# Altium footprint library self_pcblib v1.8.6.PcbLib: 164 footprints (part 6 of 11)
Each footprint in its own frame and in the unit in brackets; x right, y up, seen from the top. Pads: shape width x height; smd on the part's side, far side on the other; paste and mask are expansions set on the pad; w line width, h text height; cw(c..) or ccw(c..) is an arc to the next point about the centre after c.
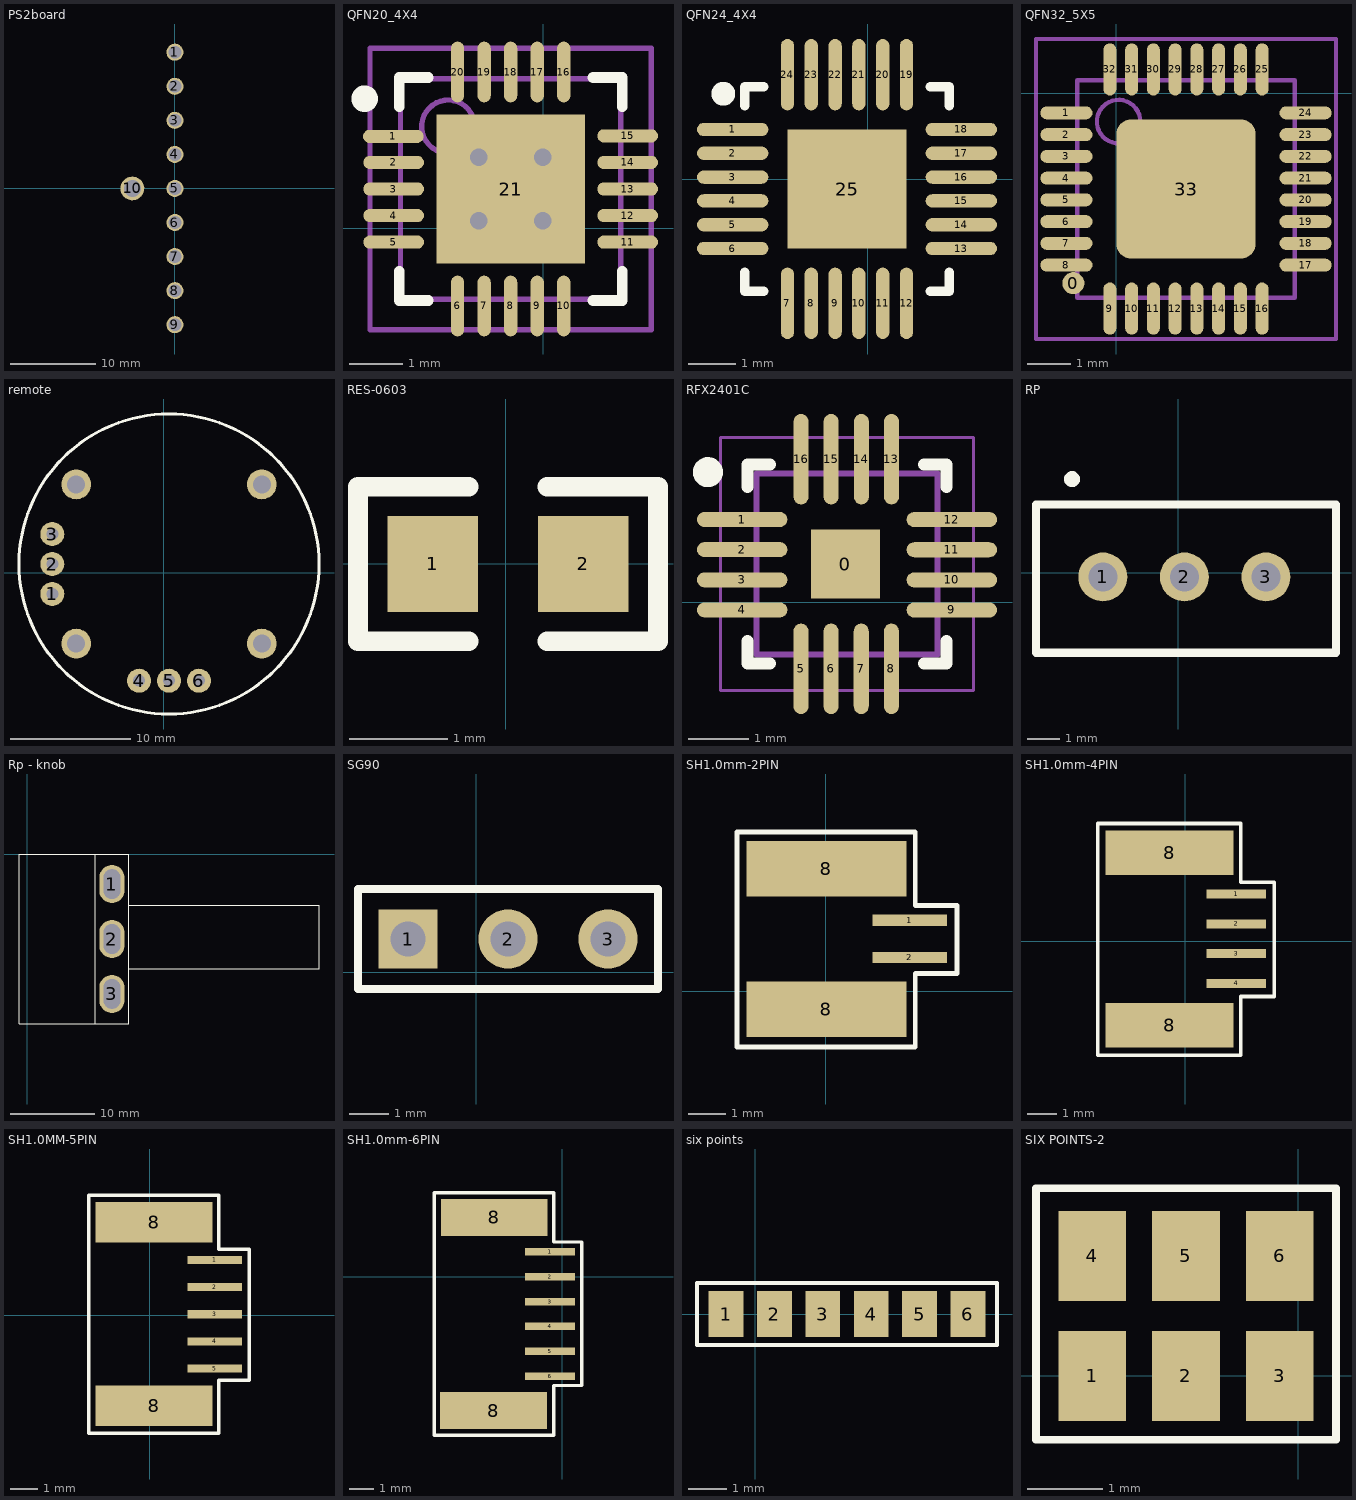
[diagram p5: the footprints below, top view; thin cyan lines are the x and y axes]

## PS2board [mm]
pads (10):
  round 2 hole 1.5: 1(0,16) 2(0,12) 3(0,8) 4(0,4) 5(0,0) 6(0,-4) 7(0,-8) 8(0,-12) 9(0,-16)
  round 2.8 hole 2: 10(-5,0)
Bottom Overlay:
  lines w0.203: 1.225,-17.673 -6,-17.673 -6,-12 -6,12 -6,17.546 1.987,17.546 ; 5,-13.665 5,14.072
  lines w0.254: 1.225,-17.673 ccw(c1.098,-13.792) 4.978,-13.665 ; 1.987,17.546 cw(c1.756,14.302) 5,14.072

## QFN20_4X4 [mil]
pads (21):
  oval 45x9.84 smd: 1(-111,68) 2(-110.74,48.69) 3(-110.74,29) 4(-110.74,9.31) 5(-110.74,-10.37) 11(62.74,-10.37) 12(62.74,9.31) 13(62.74,29) 14(62.74,48.69) 15(62.74,68.37)
  oval 9.84x45 smd: 6(-63.37,-57.74) 7(-43.69,-57.74) 8(-24,-57.74) 9(-4.32,-57.74) 10(15.37,-57.74) 16(15.37,115.74) 17(-4.32,115.74) 18(-24,115.74) 19(-43.69,115.74) 20(-63.37,115.74)
  rect 110.24x110.24 smd: 21(-24,29)
via -47.62,52.62 diameter 25.98 hole 12.99
via -0.38,52.62 diameter 25.98 hole 12.99
via -47.62,5.38 diameter 25.98 hole 12.99
via -0.38,5.38 diameter 25.98 hole 12.99
Top Overlay:
  circle w9.84: c-132.27,95.93 r4.92
  lines w7.87: -106.68,-32.02 -106.68,-53.68 -85.02,-53.68 ; -106.68,90.02 -106.68,111.68 -85.02,111.68 ; 37.02,-53.68 58.68,-53.68 58.68,-32.02 ; 37.02,111.68 58.68,111.68 58.68,90.02
Mechanical 13:
  circle w3.94: c-70.26,75.26 r19.68
  lines w3.94: -105.69,-52.69 -105.69,110.69 57.69,110.69 57.69,-52.69 -105.69,-52.69
Mechanical 15:
  lines w3.94: -43.69,29 -4.32,29 ; -24,9.31 -24,48.69 ; -128.33,-75.33 -128.33,133.33 80.33,133.33 80.33,-75.33 -128.33,-75.33
3D body "User Library-QFN20_4x4x0_8.STEP": height 30.71, standoff -0.79, extent -103.13,-50.27 55.13,108

## QFN24_4X4 [mm]
pads (25):
  oval 1.5x0.28 smd: 1(-2.832,1.047) 2(-2.832,0.547) 3(-2.832,0.047) 4(-2.832,-0.453) 5(-2.832,-0.953) 6(-2.832,-1.453) 13(1.968,-1.453) 14(1.968,-0.953) 15(1.968,-0.453) 16(1.968,0.047) 17(1.968,0.547) 18(1.968,1.047)
  oval 0.28x1.5 smd: 7(-1.682,-2.603) 8(-1.182,-2.603) 9(-0.682,-2.603) 10(-0.182,-2.603) 11(0.318,-2.603) 12(0.818,-2.603) 19(0.818,2.197) 20(0.318,2.197) 21(-0.182,2.197) 22(-0.682,2.197) 23(-1.182,2.197) 24(-1.682,2.197)
  rect 2.5x2.5 smd: 25(-0.432,-0.203)
Top Overlay:
  circle w0.25: c-3.032,1.797 r0.125
  lines w0.2: -2.582,-1.953 -2.582,-2.353 -2.182,-2.353 ; -2.582,1.547 -2.582,1.947 -2.182,1.947 ; 1.318,-2.353 1.718,-2.353 1.718,-1.953 ; 1.318,1.947 1.718,1.947 1.718,1.547
3D body "User Library-QFN24.STEP": height 0.9, standoff 0, extent -2.435,-2.208 1.575,1.802

## QFN32_5X5 [mm]
pads (34):
  round 0.508 smd: 0(-0.991,-4.369)
  oval 1.2x0.3 smd: 1(-1.15,-0.452) 2(-1.15,-0.952) 3(-1.15,-1.452) 4(-1.15,-1.952) 5(-1.15,-2.452) 6(-1.15,-2.952) 7(-1.15,-3.452) 8(-1.15,-3.952) 17(4.35,-3.952) 18(4.35,-3.452) 19(4.35,-2.952) 20(4.35,-2.452) 21(4.35,-1.952) 22(4.35,-1.452) 23(4.35,-0.952) 24(4.35,-0.452)
  oval 0.3x1.2 smd: 9(-0.15,-4.952) 10(0.35,-4.952) 11(0.85,-4.952) 12(1.35,-4.952) 13(1.85,-4.952) 14(2.35,-4.952) 15(2.85,-4.952) 16(3.35,-4.952) 25(3.35,0.548) 26(2.85,0.548) 27(2.35,0.548) 28(1.85,0.548) 29(1.35,0.548) 30(0.85,0.548) 31(0.35,0.548) 32(-0.15,0.548)
  rrect20% 3.2x3.2 smd: 33(1.6,-2.202)
Mechanical 13:
  circle w0.1: c0.05,-0.652 r0.5
  lines w0.1: -0.9,-4.702 -0.9,0.298 4.1,0.298 4.1,-4.702 -0.9,-4.702
Mechanical 15:
  lines w0.1: 1.1,-2.202 2.1,-2.202 ; 1.6,-2.702 1.6,-1.702 ; -1.85,-5.652 -1.85,1.248 5.05,1.248 5.05,-5.652 -1.85,-5.652
3D body "QFN32 (FTDI).STEP": height 0.8, standoff -0.05, extent -0.874,-4.742 4.126,0.258

## remote [mm]
pads (10):
  round 2 hole 1: 1(-9.329,-1.749) 2(-9.329,0.751) 3(-9.329,3.251) 4(-2.079,-8.999) 5(0.421,-8.999) 6(2.921,-8.999)
  round 2.5 hole 1.5: ""(-7.329,-5.899) ""(-7.329,7.401) ""(8.171,-5.899) ""(8.171,7.401)
Top Overlay:
  circle w0.254: c0.421,0.751 r12.53

## RES-0603 [mm]
pads (2):
  rect 0.93x0.98 smd: 1(-0.745,0) 2(0.795,0)
Top Overlay:
  lines w0.2: -0.375,-0.79 -1.51,-0.79 -1.51,0.79 -0.375,0.79 ; 0.425,-0.79 1.56,-0.79 1.56,0.79 0.425,0.79
3D body "User Library-RES_1609-0603.STEP": height 0.56, standoff 0, extent -0.825,-0.4 0.876,0.4

## RFX2401C [mm] "QFN3*3"
pads (17):
  rect 1.143x1.143 smd: 0(3.302,0.635)
  oval 1.5x0.25 smd: 1(1.588,1.373) 2(1.588,0.873) 3(1.588,0.373) 4(1.588,-0.127) 9(5.067,-0.128) 10(5.067,0.372) 11(5.067,0.872) 12(5.067,1.372)
  oval 0.25x1.5 smd: 5(2.564,-1.104) 6(3.064,-1.104) 7(3.564,-1.104) 8(4.064,-1.104) 13(4.065,2.374) 14(3.565,2.374) 15(3.065,2.374) 16(2.565,2.374)
Top Overlay:
  circle w0.25: c1.018,2.159 r0.125
  lines w0.2: 1.677,-0.64 1.677,-1.015 2.052,-1.015 ; 1.677,1.91 1.677,2.285 2.052,2.285 ; 4.602,-1.015 4.977,-1.015 4.977,-0.64 ; 4.602,2.285 4.977,2.285 4.977,1.91
Mechanical 13:
  lines w0.1: 1.827,-0.865 1.827,2.135 4.827,2.135 4.827,-0.865 1.827,-0.865
Mechanical 15:
  lines w0.05: 1.227,-1.465 1.227,2.735 5.427,2.735 5.427,-1.465 1.227,-1.465
  lines w0.1: 2.827,0.635 3.827,0.635 ; 3.327,0.135 3.327,1.135
3D body: height 1, standoff 0.05, extent 1.827,-0.865 4.827,2.135

## RP [mil]
pads (3):
  round 60 hole 35.43: 1(-92.36,-5) 2(7.64,-5) 3(107.64,-5)
Top Overlay:
  circle w10: c-130.18,115 r4.81
  lines w10: -174.36,-98 -174.36,84 193.64,84 193.64,-98 -174.36,-98
3D body "Trimming Potentiometer Vertical 3296W 104 - 100k.step": height 457.87, standoff -251.97, extent -178.96,-102.16 196.24,88

## Rp - knob [mm]
pads (3):
  oval 3x4.5 hole 2 slot 3.5 at 90 deg: 1(10,-3.5) 2(10,-10) 3(10,-16.5)
Top Overlay:
  lines w0.127: 8,-20 8,0 ; 12,-13.5 34.5,-13.5 34.5,-6 12,-6 ; -1,-20 -1,0 12,0 12,-20 -1,-20

## SG90 [mm]
pads (3):
  rect 1.5x1.5 hole 0.9: 1(-1.727,0.838)
  round 1.5 hole 0.9: 2(0.813,0.838) 3(3.353,0.838)
Top Overlay:
  lines w0.2: -2.997,-0.432 -2.997,2.108 4.623,2.108 4.623,-0.432 -2.997,-0.432
3D body "1001-3.STEP": height 8.54, standoff -3, extent -3.023,-0.457 4.597,2.083
3D body "User Library-SG90-1.STEP": height 12.06, standoff -0.19, extent -3.073,-0.483 28.423,36.961

## SH1.0mm-2PIN [mm]
pads (4):
  rect 2x0.3 smd: 1(2.269,1.914) 2(2.269,0.914)
  rect 4.3x1.5 smd: 8(0.025,-0.483) 8(0.025,3.302)
Top Overlay:
  lines w0.127: -2.388,-1.499 2.419,-1.499 2.419,0.483 3.544,0.483 3.544,2.314 2.419,2.314 2.419,4.293 -2.388,4.293 -2.388,-1.499

## SH1.0mm-4PIN [mm]
pads (6):
  rect 2x0.3 smd: 1(1.71,1.584) 2(1.71,0.584) 3(1.71,-0.416) 4(1.71,-1.416)
  rect 4.3x1.5 smd: 8(-0.533,-2.819) 8(-0.533,2.972)
Top Overlay:
  lines w0.127: -2.946,-3.835 1.86,-3.835 1.86,-1.854 2.985,-1.854 2.985,1.984 1.86,1.984 1.86,3.962 -2.946,3.962 -2.946,-3.835

## SH1.0MM-5PIN [mm]
pads (7):
  rect 2x0.3 smd: 1(2.396,2.041) 2(2.396,1.041) 3(2.396,0.041) 4(2.396,-0.959) 5(2.396,-1.959)
  rect 4.3x1.5 smd: 8(0.152,-3.327) 8(0.152,3.429)
Top Overlay:
  lines w0.127: -2.261,-4.343 2.546,-4.343 2.546,-2.388 3.671,-2.388 3.671,2.441 2.546,2.441 2.546,4.42 -2.261,4.42 -2.261,-4.343

## SH1.0mm-6PIN [mm]
pads (8):
  rect 2x0.3 smd: 1(-0.5,1) 2(-0.5,0) 3(-0.5,-1) 4(-0.5,-2) 5(-0.5,-3) 6(-0.5,-4)
  rect 4.3x1.5 smd: 8(-2.769,-5.385) 8(-2.743,2.388)
Top Overlay:
  lines w0.127: -5.156,-6.375 -5.156,3.378 -0.35,3.378 -0.35,1.4 0.775,1.4 0.775,-4.375 -0.35,-4.375 -0.35,-6.375 -5.156,-6.375
3D body "User Library-JST - SM06B-SRSS-TB (SH SERIES - 1_0mm PITCH WIRE-TO-BOARD, SMT, RA).STEP": height 4.25, standoff -0.7, extent -4.95,-5.5 -2.05,2.5

## six points [mm] "外部焊接6个焊点"
pads (6):
  rect 0.9x1.2 smd: 1(-0.75,0) 2(0.5,0) 3(1.75,0) 4(3,0) 5(4.25,0) 6(5.5,0)
Top Overlay:
  lines w0.103: -1.5,-0.8 1.5,-0.8 6.25,-0.8 ; -1.5,-0.75 -1.5,0.75 ; -1.5,0.8 1.5,0.8 6.25,0.8 ; 6.25,-0.75 6.25,0.75

## SIX POINTS-2 [mm]
pads (6):
  rect 0.9x1.2 smd: 1(-2.75,0) 2(-1.5,0) 3(-0.25,0) 4(-2.75,1.6) 5(-1.5,1.6) 6(-0.25,1.6)
Top Overlay:
  lines w0.103: -3.5,-0.85 -3.5,-0.75 -3.5,0.75 -3.5,2.5 -0.5,2.5 0.5,2.5 0.5,1 0.5,-0.85 -0.5,-0.85 -3.5,-0.85